# Altium footprint library DriverBoard.PcbLib: 24 footprints (part 1 of 2)
Each footprint in its own frame and in the unit in brackets; x right, y up, seen from the top. Pads: shape width x height; smd on the part's side, far side on the other; paste and mask are expansions set on the pad; w line width, h text height; cw(c..) or ccw(c..) is an arc to the next point about the centre after c.
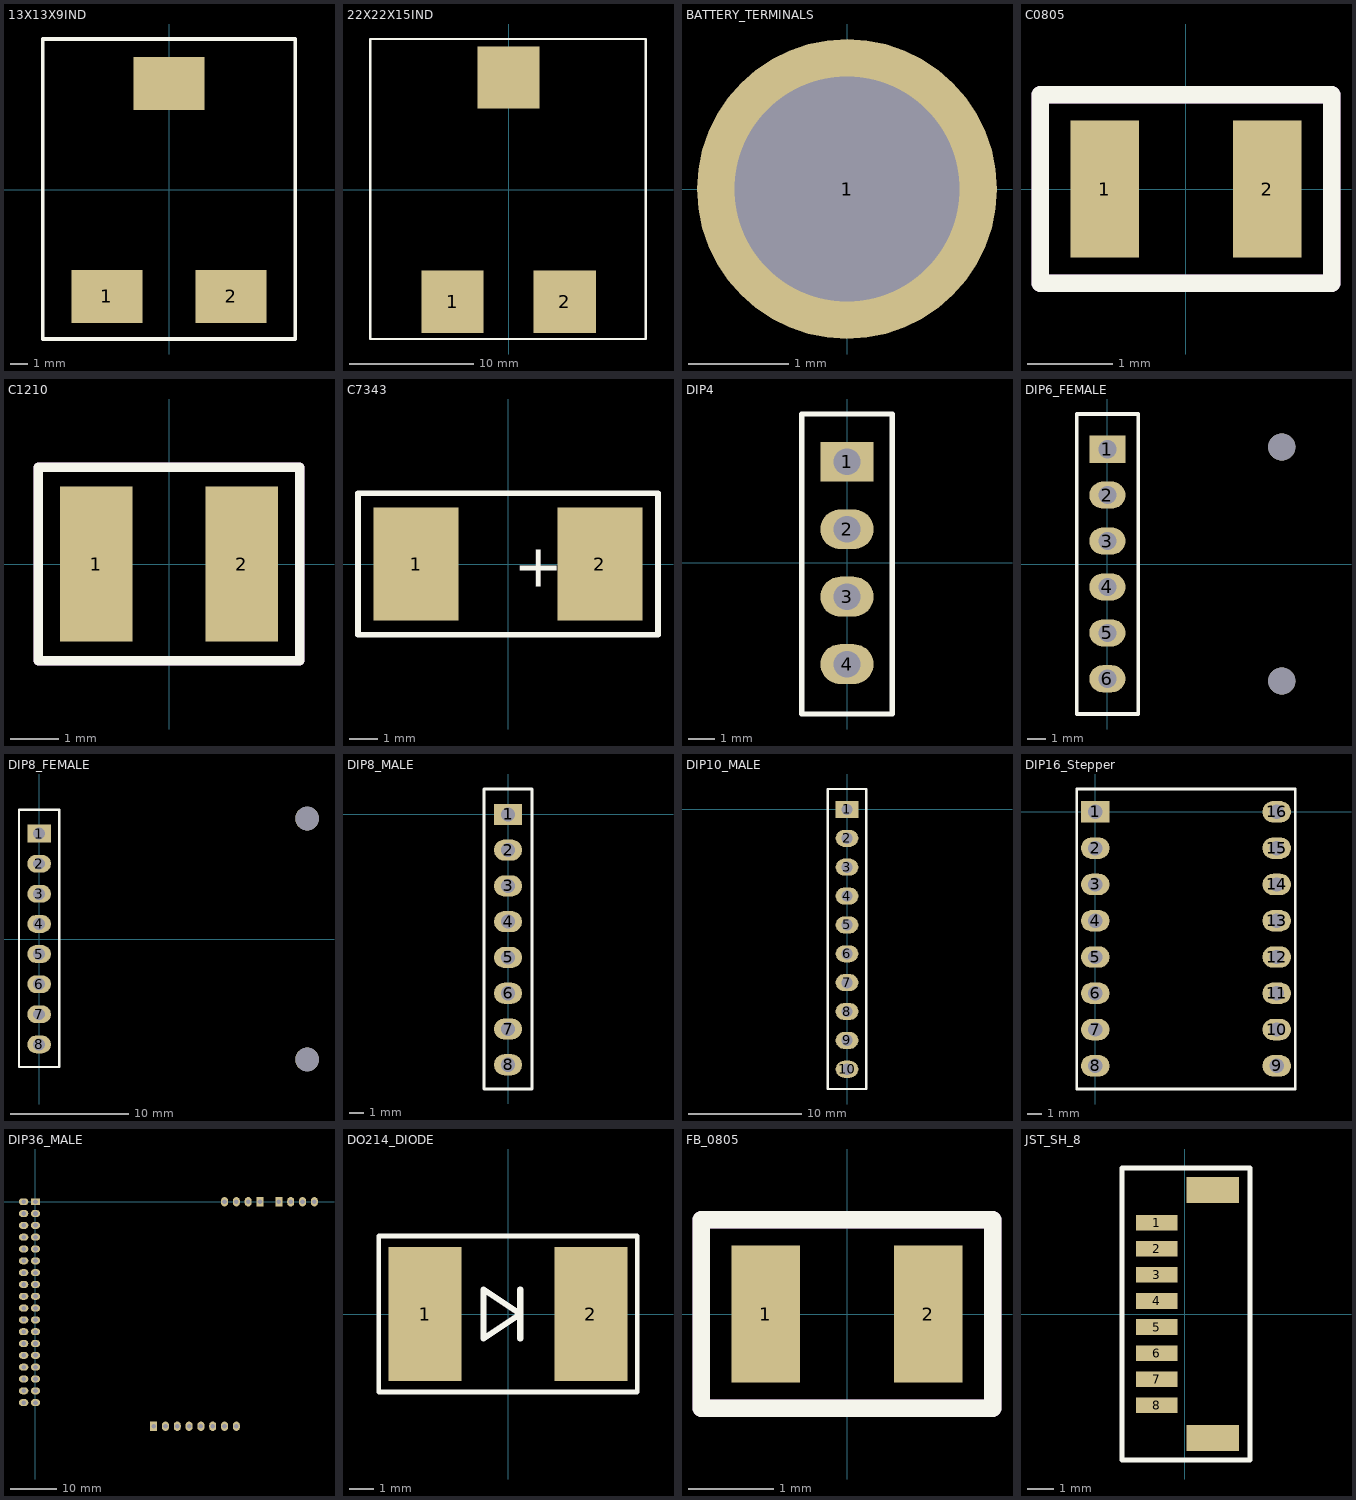
[diagram p0: the footprints below, top view; thin cyan lines are the x and y axes]

## 13X13X9IND [mm]
pads (3):
  rect 4x3 smd: 1(-3.5,-6) 2(3.5,-6) ""(0,6)
Top Overlay:
  lines w0.2: -7.1,-8.4 7.1,-8.4 7.1,8.5 -7.1,8.5 -7.1,-8.4
3D body "Coilcraft-SER1390.step": height 9.01, standoff 0.01, extent -6.75,-6.75 6.75,6.75

## 22X22X15IND [mm]
pads (3):
  rect 5x5 smd: 1(-4.5,-9) 2(4.5,-9) ""(0,9)
Top Overlay:
  lines w0.2: -11.1,-12 11,-12 11,12.1 -11.1,12.1 -11.1,-12
3D body "WE7443630070.stp": height 14.01, standoff 0.01, extent -10.75,-10.6 10.75,10.4

## BATTERY_TERMINALS [mm]
pads (1):
  round 3 hole 2.25: 1(0,0)

## C0805 [mm]
pads (2):
  rect 0.8x1.6 smd: 1(-0.95,0) 2(0.95,0)
Top Overlay:
  lines w0.2: -1.7,-1.1 -1.7,1.1 1.7,1.1 1.7,-1.1 -1.7,-1.1
Mechanical 29:
  lines w0.2: -1.7,-1.1 1.7,-1.1 1.7,1.1 -1.7,1.1 -1.7,-1.1
  text ".Designator" at -1.2,-0.5 h0.8
3D body "CAP_0805.stp": height 1.4, standoff 0, extent -1.1,-0.725 1.1,0.725

## C1210 [mm]
pads (2):
  rect 1.5x3.2 smd: 1(-1.5,0) 2(1.5,0)
Top Overlay:
  lines w0.2: -2.7,-2 -2.7,2 2.7,2 2.7,-2 -2.7,-2
Mechanical 29:
  lines w0.2: -2.7,-2 2.7,-2 2.7,2 -2.7,2 -2.7,-2
  text ".Designator" at -1.2,-0.5 h0.8
3D body "c1210c106k3pactu.stp": height 2.11, standoff 0.01, extent -1.7,-1.35 1.7,1.35

## C7343 [mm]
pads (2):
  rect 3x4 smd: 1(-3.25,0) 2(3.25,0)
Top Overlay:
  lines w0.2: -5.3,-2.5 5.3,-2.5 5.3,2.5 -5.3,2.5 -5.3,-2.5
  text "+" at 0.2,-0.8 h1.52
3D body "T510X107M020ATE040.step": height 4.32, standoff 0.01, extent -3.8,-2.3 3.8,2.3

## DIP4 [mm]
pads (4):
  rect 2x1.5 hole 1: 1(0,3.81)
  oval 2x1.5 hole 1: 2(0,1.27) 3(0,-1.27) 4(0,-3.81)
Top Overlay:
  lines w0.2: -1.7,-5.69 1.7,-5.69 1.7,5.61 -1.7,5.61 -1.7,-5.69
3D body "4pinhdr.stp": height 8.55, standoff -2.99, extent -1.27,-5.08 1.27,5.08

## DIP6_FEMALE [mm]
pads (8):
  rect 2x1.5 hole 1: 1(0,6.35)
  oval 2x1.5 hole 1: 2(0,3.81) 3(0,1.27) 4(0,-1.27) 5(0,-3.81) 6(0,-6.35)
  round 1.5 hole 1.5 unplated mask+0.5: ""(9.652,-6.477) ""(9.652,6.477)
Top Overlay:
  lines w0.2: -1.7,-8.3 -1.7,8.3 1.7,8.3 1.7,-8.3 -1.7,-8.3
3D body "User Library-zl262-6s_p2-54_l15-74_w2-54_h8-5.step": height 8.5, standoff -3, extent -1.27,-7.87 1.27,7.87
3D body "Adafruit MCP4725.step": height 13.92, standoff 2.38, extent -2,-9 12,9

## DIP8_FEMALE [mm]
pads (10):
  rect 2x1.5 hole 1: 1(0,8.89)
  oval 2x1.5 hole 1: 2(0,6.35) 3(0,3.81) 4(0,1.27) 5(0,-1.27) 6(0,-3.81) 7(0,-6.35) 8(0,-8.89)
  round 2 hole 2 unplated mask+0.5: ""(22.606,-10.16) ""(22.606,10.16)
Top Overlay:
  lines w0.2: -1.7,-10.8 1.7,-10.8 1.7,10.9 -1.7,10.9 -1.7,-10.8
3D body "Adafruit MAX31865.step": height 21.01, standoff 2.38, extent -2.7,-12.7 25.24,12.7
3D body "User Library-zl262-8s_p2-54_l20-82_w2-54_h8-5.step": height 8.5, standoff -3, extent -1.27,-10.41 1.27,10.41

## DIP8_MALE [mm]
pads (8):
  rect 2x1.5 hole 1: 1(0,0)
  oval 2x1.5 hole 1: 2(0,-2.54) 3(0,-5.08) 4(0,-7.62) 5(0,-10.16) 6(0,-12.7) 7(0,-15.24) 8(0,-17.78)
Top Overlay:
  lines w0.2: -1.7,-19.5 1.7,-19.5 1.7,1.8 -1.7,1.8 -1.7,-19.5
3D body "PREC008SAAN-RC.STEP": height 8.38, standoff -3.05, extent -1.265,-19.05 1.275,1.27

## DIP10_MALE [mm]
pads (10):
  rect 2x1.5 hole 1: 1(0,0)
  oval 2x1.5 hole 1: 2(0,-2.54) 3(0,-5.08) 4(0,-7.62) 5(0,-10.16) 6(0,-12.7) 7(0,-15.24) 8(0,-17.78) 9(0,-20.32) 10(0,-22.86)
Top Overlay:
  lines w0.2: -1.7,-24.6 1.7,-24.6 1.7,1.8 -1.7,1.8 -1.7,-24.6
3D body "PREC010SAAN-RC.STEP": height 8.38, standoff -3.05, extent -1.265,-24.13 1.275,1.27

## DIP16_Stepper [mm]
pads (16):
  rect 2x1.5 hole 1: 1(0,0)
  oval 2x1.5 hole 1: 2(0,-2.54) 3(0,-5.08) 4(0,-7.62) 5(0,-10.16) 6(0,-12.7) 7(0,-15.24) 8(0,-17.78) 9(12.7,-17.78) 10(12.7,-15.24) 11(12.7,-12.7) 12(12.7,-10.16) 13(12.7,-7.62) 14(12.7,-5.08) 15(12.7,-2.54) 16(12.7,0)
Top Overlay:
  lines w0.2: -1.3,-19.4 -1.3,1.6 14,1.6 14,-19.4 -1.3,-19.4
3D body "tmc2100.step": height 21.29, standoff 2.46, extent -1.27,-19.05 13.97,1.27
3D body "User Library-zl262-8s_p2-54_l20-82_w2-54_h8-5.step": height 8.5, standoff -3, extent -1.27,-19.3 1.27,1.52
3D body "User Library-zl262-8s_p2-54_l20-82_w2-54_h8-5.step": height 8.5, standoff -3, extent 11.43,-19.3 13.97,1.52

## DIP36_MALE [mm]
pads (52):
  oval 1.5x2 hole 1: 4(40.64,0) 5(43.18,0) 6(45.72,0) 9(54.864,0) 10(57.404,0) 11(59.944,0) 54(43.18,-48.26) 55(40.64,-48.26) 56(38.1,-48.26) 57(35.56,-48.26) 58(33.02,-48.26) 59(30.48,-48.26) 60(27.94,-48.26)
  rect 2x1.5 hole 1: 5V1(0,0)
  oval 2x1.5 hole 1: 5V2(-2.54,0) 22(0,-2.54) 23(-2.54,-2.54) 24(0,-5.08) 25(-2.54,-5.08) 26(0,-7.62) 27(-2.54,-7.62) 28(0,-10.16) 29(-2.54,-10.16) 30(0,-12.7) 31(-2.54,-12.7) 32(0,-15.24) 33(-2.54,-15.24) 34(0,-17.78) 35(-2.54,-17.78) 36(0,-20.32) 37(-2.54,-20.32) 38(0,-22.86) 39(-2.54,-22.86) 40(0,-25.4) 41(-2.54,-25.4) 42(0,-27.94) 43(-2.54,-27.94) 44(0,-30.48) 45(-2.54,-30.48) 46(0,-33.02) 47(-2.54,-33.02) 48(0,-35.56) 49(-2.54,-35.56) 50(0,-38.1) 51(-2.54,-38.1) 52(0,-40.64) 53(-2.54,-40.64) GND1(0,-43.18) GND2(-2.54,-43.18)
  rect 1.5x2 hole 1: 7(48.26,0) 8(52.324,0) 61(25.4,-48.26)
3D body "User Library-arduino_MEGA2650-1.STEP": height 13.2, standoff 2.69, extent -7.67,-50.76 93.93,2.58
3D body "36Pos2Raow.stp": height 9.26, standoff -2.89, extent -3.81,-44.45 1.27,1.27
3D body "4pinhdr.stp": height 8.55, standoff -2.99, extent 51.054,-1.27 61.214,1.27
3D body "4pinhdr.stp": height 8.55, standoff -2.99, extent 39.37,-1.27 49.53,1.27
3D body "PREC008SAAN-RC.STEP": height 8.38, standoff -3.05, extent 24.13,-49.525 44.45,-46.985

## DO214_DIODE [mm]
pads (2):
  rect 3x5.5 smd: 1(-3.4,0) 2(3.4,0)
Top Overlay:
  lines w0.2: -5.3,-3.2 -5.3,3.2 5.3,3.2 5.3,-3.2 -5.3,-3.2
  lines w0.254: 0.5,-1 0.5,1 ; -1,-1 -1,1 0.5,0 -1,-1
3D body "User Library-DO-214AB SMC.step": height 2.32, standoff 0.01, extent -3.975,-2.95 3.975,2.95

## FB_0805 [mm]
pads (2):
  rect 0.8x1.6 smd: 1(-0.95,0) 2(0.95,0)
Top Overlay:
  lines w0.2: -1.7,-1.1 -1.7,1.1 1.7,1.1 1.7,-1.1 -1.7,-1.1
Mechanical 29:
  lines w0.2: -1.7,-1.1 -1.7,1.1 1.7,1.1 1.7,-1.1 -1.7,-1.1
  text "'.Designator'" at -1.3,-0.4 h0.5
3D body "FERRITE_BEAD_0805.stp": height 0.91, standoff 0.01, extent -1,-0.6 1,0.6

## JST_SH_8 [mm]
pads (10):
  rect 1.6x0.6 smd: 1(-1.075,3.5) 2(-1.075,2.5) 3(-1.075,1.5) 4(-1.075,0.5) 5(-1.075,-0.5) 6(-1.075,-1.5) 7(-1.075,-2.5) 8(-1.075,-3.5)
  rect 2x1 smd: ""(1.075,-4.75) ""(1.075,4.75)
Top Overlay:
  lines w0.2: -2.4,-5.6 2.5,-5.6 2.5,5.6 -2.4,5.6 -2.4,-5.6
3D body "jst 8 way top entry header 1_0mm.step": height 4.36, standoff 0.01, extent -1.7,-5 1.9,5